# Altium schematic symbol library Altium_Lib.SchLib: 403 symbols (part 1 of 4) (continued)
## CONN_2_POS__0353630260 (continued)
CONN HEADER 2POS 2MM R/A TIN; Manufacturer: Molex, LLC; Contact Length - Post: 0.126" (3.20mm); Shrouding: Shrouded - 4 Wall; Number of Positions Loaded: All; Pitch - Mating: 0.079" (2.00mm); Style: Board to Cable/Wire; Number of Positions: 2; Contact Length - Mating: 0.145" (3.70mm); Material Flammability Rating: UL94 V-0; Contact Shape: Square; Contact Finish - Post: Tin; Contact Material: Brass; Contact Finish Thickness - Mating: 78.7µin (2.00µm); Contact Finish - Mating: Tin; Insulation Height: 0.217" (5.51mm); Contact Type: Male Pin; Manufacturer Part Number: 0353630260; RoHS: RoHS Compliant; Part Status: Active; Row Spacing - Mating: -; Packaging: Bulk; Termination: Solder; Category: Connectors, Interconnects; Mounting Type: Through Hole, Right Angle; Number of Rows: 1; Fastening Type: Locking Ramp; Overall Contact Length: -; Connector Type: Header; Supplier: Digi-Key; Insulation Material: Polyamide (PA), Nylon; Features: -; Insulation Color: Natural; Current Rating: -; Voltage Rating: -; Operating Temperature: -; Mated Stacking Heights: -; Contact Finish Thickness - Post: 78.7µin (2.00µm); Applications: Automotive, General Purpose; Ingress Protection: -; ComponentLink1URL: https://www.molex.com/pdm_docs/sd/353630260_sd.pdf; ComponentLink1Description: https://www.molex.com/pdm_docs/sd/353630260_sd.pdf; Pricing: 1=0.3, 10=0.286, 100=0.2002, 500=0.17158, 1000=0.14298, 5000=0.12255, 10000=0.11438 (USD); Supplier Part Number: WM18931-ND
footprint CONN_2_POS__0353630260
pins: 1 (io), 2 (io)

## CONN_2_POS__0530480210
designator J?, comment 0530480210
CONN HEADER 2POS 1.25MM R/A TIN; Manufacturer: Molex, LLC; Shrouding: Shrouded - 4 Wall; Contact Length - Post: 0.091" (2.30mm); Material Flammability Rating: UL94 V-0; Pitch - Mating: 0.049" (1.25mm); Number of Positions Loaded: All; Number of Positions: 2; Style: Board to Cable/Wire; Contact Material: Phosphor Bronze; Ingress Protection: -; Mated Stacking Heights: -; Fastening Type: Detent Lock; RoHS: RoHS Compliant; Contact Shape: Rectangular; Voltage Rating: -; Connector Type: Header; Contact Finish - Mating: Tin; Packaging: Tray; Contact Type: Male Blade; Insulation Color: Natural; Insulation Height: 0.138" (3.50mm); Mounting Type: Through Hole, Right Angle; Insulation Material: Polyamide (PA), Nylon; Contact Finish - Post: Tin; Contact Length - Mating: -; Overall Contact Length: -; Row Spacing - Mating: -; Features: -; Manufacturer Part Number: 0530480210; Termination: Solder; Current Rating: -; Supplier: Digi-Key; Number of Rows: 1; Contact Finish Thickness - Mating: -; Part Status: Active; Operating Temperature: -; Category: Connectors, Interconnects; Contact Finish Thickness - Post: -; Applications: Automotive, General Purpose, Industrial, Medical; ComponentLink1URL: https://www.molex.com/pdm_docs/sd/530480210_sd.pdf; ComponentLink1Description: https://www.molex.com/pdm_docs/sd/530480210_sd.pdf; Pricing: 1=0.39, 10=0.369, 100=0.258, 500=0.22114, 1000=0.18428, 5000=0.15795, 10000=0.14742 (USD); Supplier Part Number: WM1742-ND
footprint CONN_2_POS__0530480210
pins: 1 (io), 2 (io)

## CONN_2_POS__0532610271
designator J?, comment 0532610271
CONN HEADER 2POS 1.25MM R/A SMD; Manufacturer: Molex, LLC; Style: Board to Cable/Wire; Mated Stacking Heights: 3.4mm; Pitch - Mating: 0.049" (1.25mm); Number of Positions Loaded: All; Shrouding: Shrouded - 4 Wall; Material Flammability Rating: UL94 V-0; Number of Positions: 2; Contact Finish - Mating: Tin; Contact Material: Phosphor Bronze; Operating Temperature: -; Category: Connectors, Interconnects; Overall Contact Length: -; Packaging: Tape & Reel (TR); Supplier: Digi-Key; Voltage Rating: -; Contact Length - Post: -; Contact Finish - Post: Tin; Contact Finish Thickness - Mating: 39µin (1.00µm); Contact Finish Thickness - Post: -; Applications: Automotive, General Purpose, Industrial, Medical; Row Spacing - Mating: -; Connector Type: Header; Current Rating: -; Insulation Color: Natural; Contact Length - Mating: -; Manufacturer Part Number: 0532610271; Insulation Material: Polyamide (PA46), Nylon 4/6; Ingress Protection: -; Features: Solder Retention; Mounting Type: Surface Mount, Right Angle; Contact Type: Male Blade; RoHS: RoHS Compliant; Part Status: Active; Termination: Solder; Contact Shape: Rectangular; Insulation Height: 0.134" (3.40mm); Number of Rows: 1; Fastening Type: Detent Lock; ComponentLink1URL: http://www.molex.com/pdm_docs/sd/532610271_sd.pdf; ComponentLink1Description: http://www.molex.com/pdm_docs/sd/532610271_sd.pdf; Pricing: 1000=0.4672, 2000=0.438, 3000=0.4234, 5000=0.4088, 10000=0.38836, 25000=0.3796 (USD); Supplier Part Number: WM7620TR-ND
footprint CONN_2_POS__0532610271
pins: 1 (io), 2 (io)

## CONN_2_POS__0559350210
designator J?, comment 0559350210
2.0 WTB PLG HSG ASSY RA; Manufacturer: Molex, LLC; Contact Length - Post: 0.126" (3.20mm); Contact Length - Mating: 0.144" (3.66mm); Shrouding: Shrouded - 4 Wall; Style: Board to Cable/Wire; Pitch - Mating: 0.079" (2.00mm); Connector Type: Header; Number of Positions: 2; Number of Positions Loaded: All; Insulation Color: Natural; Material Flammability Rating: -; Ingress Protection: -; Insulation Material: Polybutylene Terephthalate (PBT); Applications: General Purpose, Industrial, Medical; Mated Stacking Heights: -; Features: Board Guide; Contact Finish - Mating: Tin; Operating Temperature: -; Insulation Height: 0.264" (6.70mm); Contact Finish Thickness - Post: -; Overall Contact Length: -; Current Rating: -; Contact Finish Thickness - Mating: -; Contact Material: -; Contact Finish - Post: Tin; Voltage Rating: -; Contact Shape: Square; RoHS: RoHS Compliant; Number of Rows: 1; Mounting Type: Through Hole, Right Angle; Fastening Type: Latch Holder; Termination: Kinked Pin, Solder; Category: Connectors, Interconnects; Row Spacing - Mating: -; Manufacturer Part Number: 0559350210; Part Status: Active; Contact Type: Male Pin; Supplier: Digi-Key; Packaging: Tray; ComponentLink1URL: https://www.molex.com/pdm_docs/sd/559350210_sd.pdf; ComponentLink1Description: https://www.molex.com/pdm_docs/sd/559350210_sd.pdf; Pricing: 1=0.46, 10=0.433, 100=0.3031, 500=0.25978, 1500=0.20534, 6000=0.18555, 10500=0.17318 (USD); Supplier Part Number: WM14662-ND
footprint CONN_2_POS__0559350210
pins: 1 (io), 2 (io)

## CONN_2_POS__0705530001
designator J?, comment 0705530001
CONN HEADER 2POS .100 R/A GOLD; Manufacturer: Molex, LLC; Contact Length - Mating: 0.240" (6.10mm); Number of Positions: 2; Number of Positions Loaded: All; Pitch - Mating: 0.100" (2.54mm); Shrouding: Shrouded - 4 Wall; Category: Connectors, Interconnects; Connector Type: Header; Contact Finish - Mating: Gold; Contact Finish Thickness - Mating: 15µin (0.38µm); Contact Type: Male Pin; Fastening Type: Latch Holder; Features: -; Ingress Protection: -; Insulation Color: Black; Manufacturer Part Number: 0705530001; Mounting Type: Through Hole, Right Angle; Number of Rows: 1; Part Status: Active; Packaging: Tube; RoHS: RoHS Compliant; Row Spacing - Mating: -; Supplier: Digi-Key; Termination: Solder; ComponentLink1URL: http://www.molex.com/pdm_docs/sd/705530001_sd.pdf; ComponentLink1Description: http://www.molex.com/pdm_docs/sd/705530001_sd.pdf; Pricing: 1=0.74, 10=0.651, 50=0.5868, 100=0.5612, 250=0.5102, 500=0.45918, 1000=0.40816, 2500=0.3699, 5000=0.35714 (USD); Supplier Part Number: WM4900-ND
footprint CONN_2_POS__705530001
pins: 1 (io), 2 (io)

## CONN_2_POS__0768250002
designator J?, comment 0768250002
DUAL ROW RA HEADER TIN 2CKT; Manufacturer: Molex, LLC; Number of Positions: 2; Style: Board to Cable/Wire; Row Spacing - Mating: 0.224" (5.70mm); Number of Positions Loaded: All; Contact Length - Post: 0.142" (3.60mm); Shrouding: Shrouded - 4 Wall; Material Flammability Rating: UL94 V-0; Supplier: Digi-Key; Number of Rows: 2; RoHS: RoHS Compliant; Packaging: Tray; Manufacturer Part Number: 0768250002; Part Status: Active; Pitch - Mating: -; Connector Type: Header; Contact Type: Male Pin; Category: Connectors, Interconnects; Mounting Type: Through Hole, Right Angle; Overall Contact Length: -; Insulation Height: 0.572" (14.53mm); Termination: Solder; Contact Finish - Post: Tin; Contact Finish Thickness - Mating: 60.0µin (1.52µm); Contact Length - Mating: -; Fastening Type: Locking Ramp; Contact Finish - Mating: Tin; Contact Shape: Square; Contact Finish Thickness - Post: 60.0µin (1.52µm); Current Rating: -; Applications: Automotive, General Purpose, Industrial, Telecommunications; Voltage Rating: -; Mated Stacking Heights: -; Insulation Color: Black; Ingress Protection: -; Operating Temperature: -; Features: Board Guide, Glow Wire Compliant; Insulation Material: Liquid Crystal Polymer (LCP); Contact Material: Copper; ComponentLink1URL: https://www.molex.com/pdm_docs/sd/768250002_sd.pdf; ComponentLink1Description: https://www.molex.com/pdm_docs/sd/768250002_sd.pdf; Pricing: 1=1.08, 10=0.946, 25=0.89, 50=0.853, 100=0.816, 250=0.7418, 500=0.66762, 1000=0.59344, 2500=0.5378 (USD); Supplier Part Number: WM11969-ND
footprint CONN_2_POS__0768250002
pins: 1 (io), 2 (io)

## CONN_2_POS__B2B-XH-A(LF)(SN)
designator J?, comment B2B-XH-A(LF)(SN)
CONN HEADER XH TOP 2POS 2.5MM; Manufacturer: JST Sales America Inc.; Pitch - Mating: 0.098" (2.50mm); Style: Board to Cable/Wire; Shrouding: Shrouded - 4 Wall; Number of Positions: 2; Number of Positions Loaded: All; Contact Length - Post: 0.134" (3.40mm); Material Flammability Rating: UL94 V-0; Current Rating: 3A; Voltage Rating: 250V; Mated Stacking Heights: 9.8mm; Manufacturer Part Number: B2B-XH-A(LF)(SN); Category: Connectors, Interconnects; Supplier: Digi-Key; RoHS: RoHS Compliant; Packaging: Bulk; Part Status: Active; Connector Type: Header; Contact Type: Male Pin; Number of Rows: 1; Row Spacing - Mating: -; Mounting Type: Through Hole; Termination: Press-Fit, Solder; Fastening Type: Detent Lock; Contact Length - Mating: -; Overall Contact Length: -; Insulation Height: 0.276" (7.00mm); Contact Shape: Square; Contact Finish - Mating: Tin; Contact Finish Thickness - Mating: -; Contact Finish - Post: Tin; Contact Material: Brass; Insulation Material: Polyamide (PA66), Nylon 6/6; Features: -; Operating Temperature: -25°C ~ 85°C; Ingress Protection: -; Insulation Color: Natural; Contact Finish Thickness - Post: -; Applications: -; ComponentLink1URL: http://www.jst-mfg.com/product/pdf/eng/eXH.pdf; ComponentLink1Description: http://www.jst-mfg.com/product/pdf/eng/eXH.pdf; Supplier Part Number: 455-2247-ND
footprint CONN_2_POS__B2B-XH-A(LF)(SN)
pins: 1 (io), 2 (io)

## CONN_2_POS__S2B-XH-A(LF)(SN)
designator J?, comment S2B-XH-A(LF)(SN)
CONN HEADER XH SIDE 2POS 2.5MM; Manufacturer: JST Sales America Inc.; Contact Length - Post: 0.134" (3.40mm); Pitch - Mating: 0.098" (2.50mm); Shrouding: Shrouded - 4 Wall; Number of Positions Loaded: All; Style: Board to Cable/Wire; Number of Positions: 2; Mated Stacking Heights: 6.1mm; Material Flammability Rating: UL94 V-0; Current Rating: 3A; Voltage Rating: 250V; Overall Contact Length: -; Packaging: Bulk; Number of Rows: 1; Contact Length - Mating: -; Contact Shape: Square; Supplier: Digi-Key; Contact Type: Male Pin; Connector Type: Header; Manufacturer Part Number: S2B-XH-A(LF)(SN); Insulation Height: 0.240" (6.10mm); RoHS: RoHS Compliant; Mounting Type: Through Hole, Right Angle; Fastening Type: Detent Lock; Contact Finish - Post: Tin; Category: Connectors, Interconnects; Part Status: Active; Termination: Press-Fit, Solder; Contact Finish Thickness - Mating: -; Contact Finish - Mating: Tin; Row Spacing - Mating: -; Ingress Protection: -; Contact Finish Thickness - Post: -; Applications: -; Insulation Color: Natural; Insulation Material: Polyamide (PA66), Nylon 6/6; Operating Temperature: -25°C ~ 85°C; Contact Material: Brass; Features: -; ComponentLink1URL: http://www.jst-mfg.com/product/pdf/eng/eXH.pdf; ComponentLink1Description: http://www.jst-mfg.com/product/pdf/eng/eXH.pdf; Pricing: 1=0.17, 10=0.162, 100=0.1126, 500=0.09524, 1000=0.07792, 5000=0.06927, 10000=0.06277 (USD); Supplier Part Number: 455-2257-ND
footprint CONN_2_POS__S2B-XH-A(LF)(SN)
pins: 1 (io), 2 (io)

## CONN_3_POS__0022057035
designator J?, comment 0022057035
CONN HEADER 3POS 2.5MM R/A TIN; Manufacturer: Molex, LLC; Shrouding: Shrouded - 4 Wall; Style: Board to Cable/Wire; Number of Positions Loaded: All; Number of Positions: 3; Contact Length - Post: 0.138" (3.50mm); Pitch - Mating: 0.098" (2.50mm); Material Flammability Rating: UL94 V-0; Manufacturer Part Number: 0022057035; Supplier: Digi-Key; Category: Connectors, Interconnects; Mounting Type: Through Hole, Right Angle; Row Spacing - Mating: -; Number of Rows: 1; Contact Finish - Mating: Tin; Contact Shape: Circular; Insulation Height: 0.193" (4.90mm); Voltage Rating: -; Current Rating: -; Insulation Color: Natural; Termination: Solder; RoHS: RoHS Compliant; Connector Type: Header; Part Status: Active; Packaging: Bulk; Contact Finish - Post: Tin; Contact Finish Thickness - Mating: 160µin (4.06µm); Insulation Material: Polyamide (PA66), Nylon 6/6, Glass Filled; Contact Material: Brass; Overall Contact Length: -; Operating Temperature: -; Features: -; Contact Finish Thickness - Post: 160µin (4.06µm); Applications: Automotive, General Purpose, Industrial, Medical, Telecommunications; Mated Stacking Heights: -; Contact Type: Male Pin; Ingress Protection: -; Contact Length - Mating: 0.138" (3.50mm); Fastening Type: Detent Lock; ComponentLink1URL: http://www.molex.com/pdm_docs/sd/022057035_sd.pdf; ComponentLink1Description: http://www.molex.com/pdm_docs/sd/022057035_sd.pdf; Pricing: 1=0.54, 10=0.502, 100=0.3846, 500=0.3344, 1000=0.27588, 5000=0.24244, 10000=0.22572 (USD); Supplier Part Number: WM18901-ND
footprint CONN_3_POS__0022057035
pins: 1 (io), 2 (io), 3 (io)

## CONN_3_POS__0532610371
designator J?, comment 53261-0371
CONN HEADER SMD R/A 3POS 1.25MM; Manufacturer: Molex; Current Rating: 1 A; Mounting Angle: Right Angle; Number of Positions: 3 Position; Voltage Rating: 125 V; Supplier 1: Mouser; Manufacturer Part Number: 53261-0371; RoHS: RoHS Compliant; Category: Headers & Wire Housings; Stock 1: 19235; Pricing 1: 1=1.13, 10=0.987, 100=0.845, 500=0.659, 1000=0.292, 2000=0.257 (USD); Accessory Type: -; Contact Plating: Tin; Contact Type: -; Housing Material: Thermoplastic; Number of Rows: 1 Row; Packaging: Cut Tape; Product: Headers; Series: 53261; Termination Style: SMD/SMT; Type: Shrouded; Brand: Molex; Contact Material: Tin; Flammability Rating: UL 94 V-0; Mounting Style: SMD/SMT; Pitch: 1.25 mm; Row Spacing: -; Contact Gender: Pin (Male); Housing Color: Natural; Maximum Operating Temperature: + 105 C; Minimum Operating Temperature: - 40 C; Product Type: Headers & Wire Housings; Standard Pack Qty: 1000; Subcategory: Headers & Wire Housings; Tradename: PicoBlade; RoHS - Mouser: Y; Minimum Order Quantity: 1; Reeling: True; ComponentLink1URL: https://www.mouser.com/datasheet/2/276/0532610371_PCB_HEADERS-146538.pdf; ComponentLink1Description: https://www.mouser.com/datasheet/2/276/0532610371_PCB_HEADERS-146538.pdf; Supplier Part Number 1: 538-53261-0371
footprint CONN_3_POS__0532610371
pins: 1 (io), 2 (io), 3 (io)

## CONN_3_POS__0705530002
designator J?, comment 70553-0002
MOLEX - 70553-0002 - WIRE-BOARD CONNECTOR, HEADER, 3 POSITION, 2.54MM; Manufacturer: MOLEX; RoHS: YES; Manufacturer Part Number: 70553-0002; Supplier: Newark; ComponentLink1URL: http://www.farnell.com/datasheets/2209020.pdf; ComponentLink1Description: http://www.farnell.com/datasheets/2209020.pdf; ComponentLink2URL: http://www.farnell.com/cad/2023942.pdf; ComponentLink2Description: http://www.farnell.com/cad/2023942.pdf; ComponentLink3URL: http://www.farnell.com/cad/1990527.zip; ComponentLink3Description: http://www.farnell.com/cad/1990527.zip; ComponentLink4URL: http://www.farnell.com/datasheets/1024957.pdf; ComponentLink4Description: http://www.farnell.com/datasheets/1024957.pdf; Stock: 687; Supplier Part Number: 59H2871
footprint CONN_3_POS__705530002
pins: 1 (io), 2 (io), 3 (io)

## CONN_3_POS__B3B-XH-A(LF)(SN)
designator J?, comment B3B-XH-A(LF)(SN)
CONN HEADER XH TOP 3POS 2.5MM; Manufacturer: JST Sales America Inc.; Shrouding: Shrouded - 4 Wall; Style: Board to Cable/Wire; Pitch - Mating: 0.098" (2.50mm); Number of Positions Loaded: All; Number of Positions: 3; Contact Length - Post: 0.134" (3.40mm); Material Flammability Rating: UL94 V-0; Current Rating: 3A; Voltage Rating: 250V; Mated Stacking Heights: 9.8mm; Contact Finish - Post: Tin; Contact Finish Thickness - Mating: -; Contact Shape: Square; Contact Finish - Mating: Tin; Insulation Height: 0.276" (7.00mm); Mounting Type: Through Hole; Number of Rows: 1; Part Status: Active; Supplier: Digi-Key; Fastening Type: Detent Lock; Contact Length - Mating: -; Row Spacing - Mating: -; Connector Type: Header; Packaging: Bulk; Contact Type: Male Pin; Category: Connectors, Interconnects; RoHS: RoHS Compliant; Termination: Press-Fit, Solder; Manufacturer Part Number: B3B-XH-A(LF)(SN); Overall Contact Length: -; Insulation Material: Polyamide (PA66), Nylon 6/6; Features: -; Insulation Color: Natural; Operating Temperature: -25°C ~ 85°C; Ingress Protection: -; Contact Finish Thickness - Post: -; Applications: -; Contact Material: Brass; ComponentLink1URL: http://www.jst-mfg.com/product/pdf/eng/eXH.pdf; ComponentLink1Description: http://www.jst-mfg.com/product/pdf/eng/eXH.pdf; Pricing: 1=0.19, 10=0.181, 100=0.1115, 500=0.09228, 1000=0.08075, 5000=0.06921, 10000=0.06729 (USD); Supplier Part Number: 455-2248-ND
footprint CONN_3_POS__B3B-XH-A(LF)(SN)
pins: 1 (io), 2 (io), 3 (io)

## CONN_3_POS__S3B-XH-A(LF)(SN)
designator J?, comment S3B-XH-SM4-TB(LF)(SN)
CONN HEADER R/A 3POS 2.5MM; Manufacturer: JST; TotalNumberofContacts: 3; StyleConnectorsPCB: StraightHeaderPlug; TerminationConnectorsPCB: Crimp; WorkingVoltage: 250; ContactMaterialRelay: Copper Alloy; ContactPlating: Tin; MaterialConnectorsRectangularPlasticIndustrial: Polyamide; NumberofRows: 1; Gender: Male; TypeConnectorsPCB: WiretoBoard; MatingTypeConnectorsRectangularPlasticIndustrial: DetentLock; InsulationResistance: 1000000000; Supplier 1: Future Electronics; Manufacturer Part Number: S3B-XH-SM4-TB(LF)(SN); RoHS: Y; Category: Header (Plug) - Board Mount; Stock 1: 3000; Pricing 1: 500=0,4200, 1000=0,3400, 2000=0,3300, 7500=0,3150 (USD); OperatingTempRange: -25|85; CurrentRating: 3; Color: Natural; CenterLine/ContactSpacing: 2.5 mm; ComponentLink1URL: http://www.jst-mfg.com/product/pdf/eng/eXH.pdf; ComponentLink1Description: http://www.jst-mfg.com/product/pdf/eng/eXH.pdf; Supplier Part Number 1: 4056388
footprint CONN_3_POS__S3B-XH-A(LF)(SN)
pins: 1 (io), 2 (io), 3 (io)

## CONN_4_POS__22-05-7045
designator J?, comment 22-05-7045
CONN HEADER 4POS 2.5MM R/A TIN; Manufacturer: Molex Connector Corporation; Material Flammability Rating: UL94 V-0; Contact Length - Mating: 0.138" (3.50mm); Number of Positions: 4; Pitch - Mating: 0.098" (2.50mm); Style: Board to Cable/Wire; Shrouding: Shrouded - 4 Wall; Number of Positions Loaded: All; Applications: Automotive, General Purpose, Industrial, Medical, Telecommunications; Contact Finish Thickness - Post: 160µin (4.06µm); Mated Stacking Heights: -; Contact Material: Brass; Insulation Height: 0.193" (4.90mm); Overall Contact Length: -; Insulation Color: Natural; Ingress Protection: -; RoHS: RoHS Compliant; Packaging: Bulk; Contact Type: Male Pin; Termination: Solder; Contact Shape: Circular; Row Spacing - Mating: -; Insulation Material: Polyamide (PA66), Nylon 6/6, Glass Filled; Features: -; Operating Temperature: -; Category: Connectors, Interconnects; Part Status: Active; Connector Type: Header; Supplier: Digi-Key; Manufacturer Part Number: 22-05-7045; Fastening Type: Detent Lock; Contact Length - Post: 0.138" (3.50mm); Mounting Type: Through Hole, Right Angle; Contact Finish - Mating: Tin; Contact Finish Thickness - Mating: 160µin (4.06µm); Contact Finish - Post: Tin; Number of Rows: 1; Current Rating: -; Voltage Rating: -; ComponentLink1URL: http://www.molex.com/pdm_docs/sd/022057045_sd.pdf; ComponentLink1Description: http://www.molex.com/pdm_docs/sd/022057045_sd.pdf; Pricing: 1=0.79, 10=0.738, 100=0.5658, 500=0.492, 1000=0.4059, 5000=0.3567, 10000=0.3321 (USD); Supplier Part Number: WM18902-ND
footprint CONN_4_POS__22-05-7045 (2.50mm Wafer connector (molex))
pins: 1 (io), 2 (io), 3 (io), 4 (io)

## CONN_4_POS__43045-0400
designator J?, comment 0430450400
CONN HEADER 4POS 3MM RT ANG TIN; Manufacturer: Molex, LLC; Pitch - Mating: 0.118" (3.00mm); Contact Length - Post: 0.125" (3.18mm); Material Flammability Rating: UL94 V-0; Style: Board to Cable/Wire; Shrouding: Shrouded - 4 Wall; Number of Positions: 4; Number of Positions Loaded: All; Manufacturer Part Number: 0430450400; Contact Finish Thickness - Mating: 100µin (2.54µm); Supplier: Digi-Key; Packaging: Tray; RoHS: RoHS Compliant; Contact Type: Male Pin; Part Status: Active; Connector Type: Header; Contact Length - Mating: -; Mounting Type: Through Hole, Right Angle; Overall Contact Length: -; Insulation Height: 0.290" (7.37mm); Contact Shape: Square; Insulation Color: Black; Ingress Protection: -; Contact Material: Brass; Operating Temperature: -; Insulation Material: Liquid Crystal Polymer (LCP), Glass Filled; Voltage Rating: -; Current Rating: -; Mated Stacking Heights: -; Contact Finish Thickness - Post: -; Applications: General Purpose, Medical, Military, Telecommunications; Contact Finish - Mating: Tin; Termination: Solder; Fastening Type: Locking Ramp; Features: Board Lock; Contact Finish - Post: Tin; Category: Connectors, Interconnects; Number of Rows: 2; Row Spacing - Mating: 0.118" (3.00mm); ComponentLink1URL: http://www.molex.com/pdm_docs/sd/430450400_sd.pdf; ComponentLink1Description: http://www.molex.com/pdm_docs/sd/430450400_sd.pdf; Pricing: 1=1.35, 10=1.228, 50=1.1026, 100=1.0525, 250=0.95228, 500=0.8771, 1000=0.7518, 2500=0.70168, 5000=0.6666 (USD); Supplier Part Number: WM1814-ND
footprint CONN_4_POS__43045-0400
pins: 1 (io), 2 (io), 3 (io), 4 (io)

## CONN_4_POS__53047-0410
designator J?, comment 0530470410
1.25mm (.049") Pitch PicoBlade Wire-to-Board Header, Vertical, with Friction Lock, 4 Circuits; Manufacturer: Molex; Number of Contacts: 4; Contact Resistance: 20mR; Max Voltage Rating (AC): 125V; Connector Type: Blade Pin; Pitch: 0.049inch; Supplier 1: Avnet; Manufacturer Part Number: 0530470410; Stock 1: 65946; Pricing 1: 1=0.1162, 10=0.1145, 30=0.1129, 50=0.1112, 100=0.1088, 250=0.1063, 500=0.1038 (USD); Mount: Through Hole; Contact Plating: Tin; Contact Material: Bronze; Color: Natural; Housing Color: White; Housing Material: Nylon; Min Operating Temperature: -40°C; Max Operating Temperature: 85°C; Termination: Solder; Number of Rows: 1; Packaging: Tray; Number of Positions: 4; Orientation: Straight; Series: PicoBlade™ 53047; Contact Type: Blade Pin; Length: 6.75mm; Depth: 3.2mm; Contact Mating Length: 0.089inch; RoHS Compliant: Yes; ComponentLink1URL: http://components.arrow.com/part/dataview/2938462S4237926N3303?src-supplier=Arrow+Electronics; ComponentLink1Description: http://components.arrow.com/part/dataview/2938462S4237926N3303?src-supplier=Arrow+Electronics; Supplier Part Number 1: 0530470410
footprint CONN_4_POS__053047-0410
pins: 1 (io), 2 (io), 3 (io), 4 (io)

## CONN_4_POS__292206-4
designator J?, comment 292206-4
CONN HEADER 4POS R/A 1.5MM TIN; Manufacturer: TE Connectivity AMP Connectors; Current Rating: Varies by Wire Gauge; Material Flammability Rating: UL94 V-0; Voltage Rating: 50VAC; Contact Length - Mating: 0.094" (2.40mm); Contact Length - Post: 0.118" (3.00mm); Shrouding: Shrouded - 4 Wall; Style: Board to Cable/Wire; Pitch - Mating: 0.059" (1.50mm); Number of Positions: 4; Number of Positions Loaded: All; Insulation Material: Polyamide (PA), Nylon, Glass Filled; Features: -; Contact Finish Thickness - Mating: -; Ingress Protection: -; Operating Temperature: -30°C ~ 105°C; Contact Finish - Post: Tin; Contact Shape: Square; Contact Material: Brass; Insulation Height: 0.193" (4.90mm); Contact Finish Thickness - Post: -; Applications: General Purpose; Contact Finish - Mating: Tin; Insulation Color: Gray; Termination: Kinked Pin, Solder; Fastening Type: Detent Lock; Overall Contact Length: -; Mated Stacking Heights: -; Mounting Type: Through Hole, Right Angle; Manufacturer Part Number: 292206-4; Number of Rows: 1; Row Spacing - Mating: -; Category: Connectors, Interconnects; Supplier: Digi-Key; Part Status: Active; Contact Type: Male Pin; Packaging: Bulk; Connector Type: Header; RoHS: RoHS Compliant; ComponentLink1URL: https://www.te.com/commerce/DocumentDelivery/DDEController?Action=srchrtrv&DocNm=292206&DocType=Customer+Drawing&DocLang=English; ComponentLink1Description: https://www.te.com/commerce/DocumentDelivery/DDEController?Action=srchrtrv&DocNm=292206&DocType=Customer+Drawing&DocLang=English; Supplier Part Number: A98669-ND
footprint CONN_4_POS__292206-4
pins: 1 (io), 2 (io), 3 (io), 4 (io)

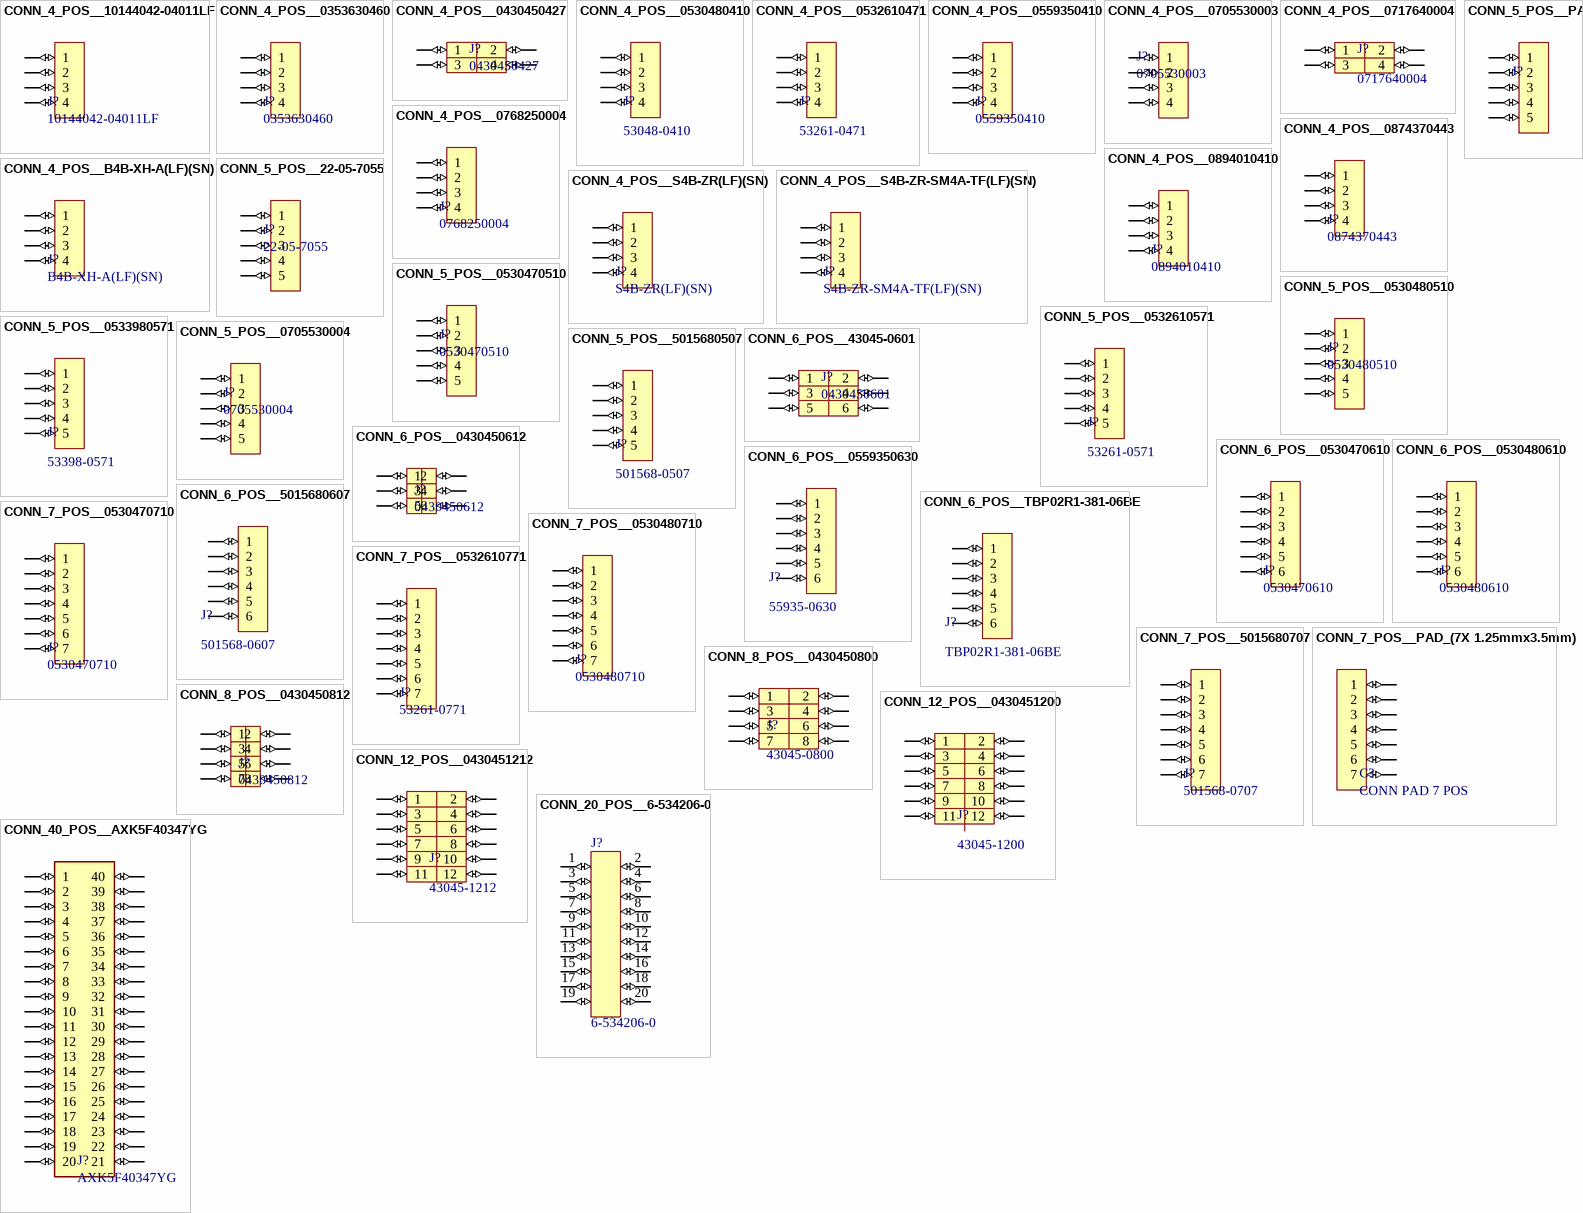
[diagram p2: symbols CONN_4_POS__10144042-04011LF to CONN_40_POS__AXK5F40347YG]

## CONN_4_POS__10144042-04011LF
designator J?, comment 10144042-04011LF
CONN HEADER SMD 4POS 0.8MM; Manufacturer: Amphenol ICC (FCI); Detailed Description: Connector Header Surface Mount 4 position 0.031" (0.80mm); Pitch - Mating: 0.031" (0.80mm); Number of Positions: 4; Style: Board to Cable/Wire; Shrouding: Shrouded - 4 Wall; Manufacturer Part Number: 10144042-04011LF; Connector Type: Header; Contact Type: Male Pin; Number of Rows: 1; Mounting Type: Surface Mount; Termination: Solder; Fastening Type: Push-Pull; Insulation Height: 0.106" (2.70mm); Contact Shape: Rectangular
footprint CONN_4_POS__10144042-04011LF
pins: 1 (io), 2 (io), 3 (io), 4 (io)

## CONN_4_POS__0353630460
designator J?, comment 0353630460
CONN HEADER 4POS 2MM R/A TIN; Manufacturer: Molex Connector Corporation; Shrouding: Shrouded - 4 Wall; Style: Board to Cable/Wire; Pitch - Mating: 0.079" (2.00mm); Material Flammability Rating: UL94 V-0; Contact Length - Mating: 0.145" (3.70mm); Contact Length - Post: 0.126" (3.20mm); Number of Positions Loaded: All; Number of Positions: 4; Insulation Color: Natural; Insulation Material: Polyamide (PA), Nylon; Contact Finish Thickness - Mating: 78.7µin (2.00µm); Insulation Height: 0.217" (5.51mm); Overall Contact Length: -; Part Status: Active; Current Rating: -; RoHS: RoHS Compliant; Ingress Protection: -; Contact Material: Brass; Contact Finish - Post: Tin; Termination: Kinked Pin, Solder; Mounting Type: Through Hole, Right Angle; Fastening Type: Locking Ramp; Row Spacing - Mating: -; Mated Stacking Heights: -; Features: -; Contact Shape: Square; Contact Type: Male Pin; Packaging: Bulk; Supplier: Digi-Key; Manufacturer Part Number: 0353630460; Category: Connectors, Interconnects; Contact Finish Thickness - Post: 78.7µin (2.00µm); Voltage Rating: -; Operating Temperature: -; Contact Finish - Mating: Tin; Number of Rows: 1; Connector Type: Header; Applications: Automotive, General Purpose; ComponentLink1URL: http://www.molex.com/pdm_docs/sd/353630460_sd.pdf; ComponentLink1Description: http://www.molex.com/pdm_docs/sd/353630460_sd.pdf; Pricing: 1=0.48, 10=0.455, 100=0.3184, 500=0.27294, 1000=0.22745, 5000=0.19496, 10000=0.18196 (USD); Supplier Part Number: WM18933-ND
footprint CONN_4_POS__0353630460
pins: 1 (io), 2 (io), 3 (io), 4 (io)

## CONN_4_POS__0430450427
designator J?, comment 0430450427
MICROFIT 3.0 VERT TH HDR DR TIN; Manufacturer: Molex, LLC; Material Flammability Rating: UL94 V-0; Style: Board to Cable/Wire; Contact Length - Post: 0.125" (3.18mm); Number of Positions: 4; Shrouding: Shrouded - 4 Wall; Number of Positions Loaded: All; Row Spacing - Mating: 0.118" (3.00mm); Connector Type: Header; Ingress Protection: -; Insulation Color: Black; Current Rating: -; Voltage Rating: -; Mated Stacking Heights: -; Contact Finish Thickness - Post: -; Applications: General Purpose, Medical, Military, Telecommunications; Contact Material: Brass; Contact Finish - Mating: Tin; Contact Finish - Post: Tin; Contact Shape: Square; Insulation Height: 0.390" (9.91mm); Part Status: Active; Contact Type: Male Pin; Manufacturer Part Number: 0430450427; Number of Rows: 2; Termination: Solder; Mounting Type: Through Hole; RoHS: RoHS Compliant; Overall Contact Length: -; Packaging: Tray; Contact Length - Mating: -; Pitch - Mating: 0.118" (3.00mm); Fastening Type: Locking Ramp; Supplier: Digi-Key; Category: Connectors, Interconnects; Contact Finish Thickness - Mating: 60µin (1.52µm); Insulation Material: Liquid Crystal Polymer (LCP), Glass Filled; Features: Board Guide; Operating Temperature: -; ComponentLink1URL: http://www.molex.com/pdm_docs/sd/430450427_sd.pdf; ComponentLink1Description: http://www.molex.com/pdm_docs/sd/430450427_sd.pdf; Supplier Part Number: WM10667-ND
footprint CONN_4_POS__0430450427
pins: 1 (io), 2 (io), 3 (io), 4 (io)

## CONN_4_POS__0530480410
designator J?, comment 53048-0410
CONN HEADER R/A 4POS 1.25MM; Manufacturer: Molex; Contact Resistance: 20mR; Current Rating: 1A; Voltage Rating: 125V; Number of Positions: 4; Insulation Resistance: 100MR; Gender: Male; Connector Type: Blade Pin; Glow Wire Compliant: Non-compliant; Supplier 1: Avnet; Manufacturer Part Number: 53048-0410; Stock 1: 44; Pricing 1: 1=0.1232 (USD); Mount: Through Hole; Case/Package: 0410; Contact Material: Bronze,Tin; Contact Plating: Tin; Color: Natural; Housing Color: Natural; Housing Material: Nylon; Min Operating Temperature: -40°C; Max Operating Temperature: 85°C; Package Quantity: 5000; Number of Rows: 1; Packaging: Tray; Contact Gender: Male; Termination: Solder; Number of Contacts: 4; Orientation: Right Angle; Number of Circuits: 4; Voltage Rating (DC): 125V; Series: PicoBlade; Contact Type: Blade Pin; Pitch: 1.25mm; Depth: 5.5mm; Radiation Hardening: No; REACH SVHC: Unknown; Lead Free: Lead Free; Flammability Rating: UL94 V-0; RoHS Compliant: Yes; ComponentLink1URL: https://www.distrelec.biz/Web/Downloads/60/_e/gg116847-116860_e.pdf?mime=application%2Fpdf&src-supplier=Distrelec; ComponentLink1Description: https://www.distrelec.biz/Web/Downloads/60/_e/gg116847-116860_e.pdf?mime=application%2Fpdf&src-supplier=Distrelec; ComponentLink2URL: http://uk.rs-online.com/webdocs/1362/0900766b81362ba7.pdf?src-supplier=RSComponents; ComponentLink2Description: http://uk.rs-online.com/webdocs/1362/0900766b81362ba7.pdf?src-supplier=RSComponents; ComponentLink3URL: http://www.molex.com/webdocs/datasheets/pdf/en-us/0530480410_PCB_HEADERS.pdf?src-supplier=Avnet; ComponentLink3Description: http://www.molex.com/webdocs/datasheets/pdf/en-us/0530480410_PCB_HEADERS.pdf?src-supplier=Avnet; ComponentLink4URL: http://www.mouser.com/ds/2/276/0530480410_PCB_HEADERS-170930.pdf?src-supplier=Mouser; ComponentLink4Description: http://www.mouser.com/ds/2/276/0530480410_PCB_HEADERS-170930.pdf?src-supplier=Mouser; Supplier Part Number 1: 53048-0410
footprint CONN_4_POS__0530480410
pins: 1 (io), 2 (io), 3 (io), 4 (io)

## CONN_4_POS__0532610471
designator J?, comment 53261-0471
CONN HEADER SMD R/A 4POS 1.25MM; Manufacturer: Molex; Current Rating: 1 A; Mounting Angle: Right Angle; Number of Positions: 4 Position; Voltage Rating: 125 V; Supplier 1: Mouser; Manufacturer Part Number: 53261-0471; RoHS: RoHS Compliant; Category: Headers & Wire Housings; Stock 1: 0; Pricing 1: 1=1.24, 10=1.08, 100=0.939, 500=0.768, 1000=0.308 (USD); Accessory Type: -; Contact Plating: Tin; Contact Type: -; Housing Material: Thermoplastic; Number of Rows: 1 Row; Packaging: Cut Tape; Product: Headers; Series: 53261; Termination Style: SMD/SMT; Type: Shrouded; Brand: Molex; Contact Material: Tin; Flammability Rating: UL 94 V-0; Mounting Style: SMD/SMT; Pitch: 1.25 mm; Row Spacing: -; Contact Gender: Pin (Male); Housing Color: Natural; Maximum Operating Temperature: + 105 C; Minimum Operating Temperature: - 40 C; Product Type: Headers & Wire Housings; Standard Pack Qty: 1000; Subcategory: Headers & Wire Housings; Tradename: PicoBlade; RoHS - Mouser: Y; Minimum Order Quantity: 1; Reeling: True; ComponentLink1URL: https://www.mouser.com/datasheet/2/276/0532610471_PCB_HEADERS-170942.pdf; ComponentLink1Description: https://www.mouser.com/datasheet/2/276/0532610471_PCB_HEADERS-170942.pdf; Supplier Part Number 1: 538-53261-0471
footprint CONN_4_POS__0532610471
pins: 1 (io), 2 (io), 3 (io), 4 (io)

## CONN_4_POS__0559350410
designator J?, comment 0559350410
2.0 WTB PLG HSG ASSY RA; Manufacturer: Molex, LLC; Connector Type: Header; Pitch - Mating: 0.079" (2.00mm); Number of Positions: 4; Shrouding: Shrouded - 4 Wall; Contact Length - Post: 0.126" (3.20mm); Contact Length - Mating: 0.144" (3.66mm); Style: Board to Cable/Wire; Number of Positions Loaded: All; Mated Stacking Heights: 7.15mm; Fastening Type: Latch Holder; Termination: Kinked Pin, Solder; Contact Shape: Square; Insulation Height: 0.264" (6.70mm); Row Spacing - Mating: -; Contact Type: Male Pin; Part Status: Active; Number of Rows: 1; Packaging: Tray; RoHS: RoHS Compliant; Mounting Type: Through Hole, Right Angle; Overall Contact Length: -; Category: Connectors, Interconnects; Supplier: Digi-Key; Manufacturer Part Number: 0559350410; Contact Finish - Post: Tin; Contact Finish Thickness - Mating: -; Contact Finish - Mating: Tin; Contact Material: -; Insulation Material: Polybutylene Terephthalate (PBT); Features: Board Guide; Operating Temperature: -; Ingress Protection: -; Material Flammability Rating: -; Insulation Color: Natural; Current Rating: -; Voltage Rating: -; Contact Finish Thickness - Post: -; Applications: General Purpose, Industrial, Medical; Supplier Part Number: WM12299-ND; ComponentLink1URL: http://www.molex.com/pdm_docs/sd/559350410_sd.pdf; ComponentLink1Description: http://www.molex.com/pdm_docs/sd/559350410_sd.pdf; Pricing: 1=0.42, 10=0.397, 100=0.2776, 500=0.23794, 1000=0.19828, 5000=0.16995, 10000=0.15862 (USD)
footprint CONN_4_POS__0559350410
pins: 1 (io), 2 (io), 3 (io), 4 (io)

## CONN_4_POS__0705530003
designator J?, comment 0705530003
CONN HEADER 4POS .100 R/A GOLD; Manufacturer: Molex, LLC; Contact Length - Mating: 0.240" (6.10mm); Number of Positions: 4; Number of Positions Loaded: All; Pitch - Mating: 0.100" (2.54mm); Shrouding: Shrouded - 4 Wall; Category: Connectors, Interconnects; Connector Type: Header; Contact Finish - Mating: Gold; Contact Finish Thickness - Mating: 15µin (0.38µm); Contact Type: Male Pin; Fastening Type: Latch Holder; Features: -; Ingress Protection: -; Insulation Color: Black; Manufacturer Part Number: 0705530003; Mounting Type: Through Hole, Right Angle; Number of Rows: 1; Packaging: Tube; Part Status: Active; RoHS: RoHS Compliant; Row Spacing - Mating: -; Supplier: Digi-Key; Termination: Solder; ComponentLink1URL: http://www.molex.com/pdm_docs/sd/705530002_sd.pdf; ComponentLink1Description: http://www.molex.com/pdm_docs/sd/705530002_sd.pdf; Pricing: 1=1.1, 10=0.971, 50=0.8758, 100=0.8378, 250=0.7616, 500=0.68544, 1000=0.60928, 2500=0.55216, 5000=0.53312 (USD); Supplier Part Number: WM4902-ND
footprint CONN_4_POS__705530003
pins: 1 (io), 2 (io), 3 (io), 4 (io)

## CONN_4_POS__0717640004
designator J?, comment 0717640004
Headers & Wire Housings HDR RA 2X02P .1" 240/110 SN; Brand: Molex; Minimum Order Quantity: 1; RoHS: RoHS Compliant; Reeling: False; Product Type: Headers & Wire Housings; Category: Headers & Wire Housings; Manufacturer: Molex; Tradename: C-Grid; Subcategory: Headers & Wire Housings; Series: 71764; Manufacturer Part Number: 0717640004; Supplier: Mouser; ComponentLink1URL: https://www.mouser.com/datasheet/2/276/0717640004_PCB_HEADERS-172989.pdf; ComponentLink1Description: https://www.mouser.com/datasheet/2/276/0717640004_PCB_HEADERS-172989.pdf; Stock: 0; Supplier Part Number: N/A
footprint CONN_4_POS__0717640004
pins: 1 (io), 2 (io), 3 (io), 4 (io)

## CONN_4_POS__0768250004
designator J?, comment 0768250004
DUAL ROW RA HEADER TIN 4CKT; Manufacturer: Molex, LLC; Number of Positions: 4; Row Spacing - Mating: 0.224" (5.70mm); Number of Positions Loaded: All; Material Flammability Rating: UL94 V-0; Style: Board to Cable/Wire; Contact Length - Post: 0.142" (3.60mm); Shrouding: Shrouded - 4 Wall; Number of Rows: 2; Connector Type: Header; Manufacturer Part Number: 0768250004; Supplier: Digi-Key; Category: Connectors, Interconnects; Contact Type: Male Pin; Pitch - Mating: 0.224" (5.70mm); Packaging: Tray; RoHS: RoHS Compliant; Part Status: Active; Voltage Rating: -; Contact Finish Thickness - Mating: 60.0µin (1.52µm); Features: Board Guide, Glow Wire Compliant; Contact Finish - Mating: Tin; Applications: Automotive, General Purpose, Industrial, Telecommunications; Contact Finish Thickness - Post: 60.0µin (1.52µm); Mated Stacking Heights: -; Insulation Color: Black; Termination: Solder; Contact Length - Mating: -; Overall Contact Length: -; Mounting Type: Through Hole, Right Angle; Fastening Type: Locking Ramp; Insulation Height: 0.572" (14.53mm); Contact Shape: Square; Operating Temperature: -; Contact Material: Copper; Contact Finish - Post: Tin; Ingress Protection: -; Insulation Material: Liquid Crystal Polymer (LCP); Current Rating: -; ComponentLink1URL: https://www.molex.com/pdm_docs/sd/768250004_sd.pdf; ComponentLink1Description: https://www.molex.com/pdm_docs/sd/768250004_sd.pdf; Pricing: 1=1.73, 10=1.572, 25=1.476, 50=1.4118, 100=1.3476, 250=1.21924, 500=1.12298, 1000=0.96255, 2500=0.89838 (USD); Supplier Part Number: WM11970-ND
footprint CONN_4_POS__0768250004
pins: 1 (io), 2 (io), 3 (io), 4 (io)

## CONN_4_POS__0874370443
designator J?, comment 0874370443
CONN HEADER 4POS 1.5MM VERT SMD; Manufacturer: Molex, LLC; Shrouding: Shrouded - 4 Wall; Number of Positions Loaded: All; Pitch - Mating: 0.059" (1.50mm); Number of Positions: 4; Style: Board to Cable/Wire; Contact Length - Mating: 0.106" (2.70mm); Mated Stacking Heights: 7.4mm; Material Flammability Rating: UL94 V-0; Packaging: Tape & Reel (TR); Number of Rows: 1; Termination: Solder; Mounting Type: Surface Mount; Row Spacing - Mating: -; RoHS: RoHS Compliant; Manufacturer Part Number: 0874370443; Supplier: Digi-Key; Contact Type: Male Pin; Connector Type: Header; Part Status: Active; Category: Connectors, Interconnects; Fastening Type: Push-Pull; Voltage Rating: -; Overall Contact Length: -; Insulation Color: Beige; Contact Finish - Post: Tin; Insulation Material: Polyamide (PA), Nylon; Contact Material: Brass Alloy; Applications: General Purpose, Medical; Ingress Protection: -; Features: -; Contact Finish Thickness - Mating: 100.0µin (2.54µm); Operating Temperature: -; Contact Shape: Square; Insulation Height: 0.199" (5.05mm); Contact Finish - Mating: Tin; Contact Length - Post: -; Current Rating: -; Contact Finish Thickness - Post: -; ComponentLink1URL: https://www.molex.com/pdm_docs/sd/874370443_sd.pdf; ComponentLink1Description: https://www.molex.com/pdm_docs/sd/874370443_sd.pdf; Pricing: 1000=0.41984, 2000=0.3936, 3000=0.38048, 5000=0.36736, 10000=0.34899, 25000=0.34112 (USD); Supplier Part Number: WM7664TR-ND
pins: 1 (io), 2 (io), 3 (io), 4 (io)

## CONN_4_POS__0894010410
designator J?, comment 0894010410
2.0MM WTB R/A HEADER 894010410; Manufacturer: Molex, LLC; Material Flammability Rating: UL94 V-0; Pitch - Mating: 0.079" (2.00mm); Number of Positions: 4; Number of Positions Loaded: All; Style: Board to Cable/Wire; Shrouding: Shrouded - 4 Wall; Contact Length - Post: 0.118" (3.00mm); Overall Contact Length: -; Insulation Height: 0.199" (5.05mm); Contact Shape: Square; Contact Finish - Mating: Tin; Contact Finish Thickness - Mating: 50.0µin (1.27µm); Contact Finish - Post: Tin; Contact Material: Brass; Insulation Material: Polyamide (PA66), Nylon 6/6; Features: -; Operating Temperature: -; Ingress Protection: -; Insulation Color: Natural; Current Rating: -; Voltage Rating: -; Mated Stacking Heights: -; Contact Finish Thickness - Post: 50.0µin (1.27µm); Applications: -; Manufacturer Part Number: 0894010410; Category: Connectors, Interconnects; Supplier: Digi-Key; RoHS: RoHS Compliant; Packaging: Bulk; Part Status: Active; Connector Type: Header; Contact Type: Male Pin; Number of Rows: 1; Row Spacing - Mating: -; Mounting Type: Through Hole, Right Angle; Termination: Kinked Pin, Solder; Fastening Type: Detent Lock; Contact Length - Mating: -; ComponentLink1URL: https://www.molex.com/pdm_docs/sd/894010410_sd.pdf; ComponentLink1Description: https://www.molex.com/pdm_docs/sd/894010410_sd.pdf; Pricing: 1=0.16, 10=0.15, 100=0.1043, 500=0.08822, 1000=0.07218, 5000=0.06416, 10000=0.05815 (USD); Supplier Part Number: WM13310-ND
footprint CONN_4_POS__0894010410
pins: 1 (io), 2 (io), 3 (io), 4 (io)

## CONN_4_POS__B4B-XH-A(LF)(SN)
designator J?, comment B4B-XH-A(LF)(SN)
CONN HEADER XH TOP 4POS 2.5MM; Manufacturer: JST Sales America Inc.; Material Flammability Rating: UL94 V-0; Voltage Rating: 250V; Current Rating: 3A; Mated Stacking Heights: 9.8mm; Number of Positions Loaded: All; Style: Board to Cable/Wire; Shrouding: Shrouded - 4 Wall; Contact Length - Post: 0.134" (3.40mm); Pitch - Mating: 0.098" (2.50mm); Number of Positions: 4; Insulation Material: Polyamide (PA66), Nylon 6/6; Features: -; Operating Temperature: -25°C ~ 85°C; Applications: -; Contact Finish Thickness - Mating: -; Insulation Color: Natural; Contact Shape: Square; Contact Finish Thickness - Post: -; Ingress Protection: -; Contact Material: Brass; Row Spacing - Mating: -; Mounting Type: Through Hole; Termination: Press-Fit, Solder; Number of Rows: 1; Overall Contact Length: -; Insulation Height: 0.276" (7.00mm); Fastening Type: Detent Lock; Contact Length - Mating: -; Contact Finish - Mating: Tin; Contact Finish - Post: Tin; Category: Connectors, Interconnects; Manufacturer Part Number: B4B-XH-A(LF)(SN); Supplier: Digi-Key; Connector Type: Header; Contact Type: Male Pin; RoHS: RoHS Compliant; Packaging: Bulk; Part Status: Active; ComponentLink1URL: http://www.jst-mfg.com/product/pdf/eng/eXH.pdf; ComponentLink1Description: http://www.jst-mfg.com/product/pdf/eng/eXH.pdf; Supplier Part Number: 455-2249-ND
footprint CONN_4_POS__B4B-XH-A(LF)(SN)
pins: 1 (io), 2 (io), 3 (io), 4 (io)

## CONN_4_POS__S4B-ZR(LF)(SN)
designator J?, comment S4B-ZR(LF)(SN)
CONN HEADER ZH SIDE 4POS 1.5MM; Manufacturer: JST Sales America Inc.; Material Flammability Rating: UL94 V-0; Current Rating: 1A; Voltage Rating: 50V; Pitch - Mating: 0.059" (1.50mm); Number of Positions: 4; Number of Positions Loaded: All; Style: Board to Cable/Wire; Shrouding: Shrouded - 4 Wall; Contact Length - Mating: 0.094" (2.40mm); Contact Length - Post: 0.106" (2.69mm); Insulation Height: 0.146" (3.70mm); Contact Shape: Circular; Contact Finish - Mating: Tin; Contact Finish Thickness - Mating: -; Contact Finish - Post: Tin; Contact Material: Brass; Insulation Material: Polyamide (PA66), Nylon 6/6, Glass Filled; Features: -; Operating Temperature: -25°C ~ 85°C; Ingress Protection: -; Insulation Color: Natural; Mated Stacking Heights: -; Contact Finish Thickness - Post: -; Applications: -; Manufacturer Part Number: S4B-ZR(LF)(SN); Category: Connectors, Interconnects; Supplier: Digi-Key; RoHS: RoHS Compliant; Packaging: Bulk; Part Status: Active; Connector Type: Header; Contact Type: Male Pin; Number of Rows: 1; Row Spacing - Mating: -; Mounting Type: Through Hole, Right Angle; Termination: Press-Fit, Solder; Fastening Type: Detent Lock; Overall Contact Length: -; ComponentLink1URL: http://www.jst-mfg.com/product/pdf/eng/eZH.pdf; ComponentLink1Description: http://www.jst-mfg.com/product/pdf/eng/eZH.pdf; Pricing: 1=0.24, 10=0.228, 100=0.1578, 500=0.1335, 1000=0.10922, 5000=0.09709, 10000=0.08799 (USD); Supplier Part Number: 455-1671-ND
footprint CONN_4_POS__S4B-ZR(LF)(SN)
pins: 1 (io), 2 (io), 3 (io), 4 (io)

## CONN_4_POS__S4B-ZR-SM4A-TF(LF)(SN)
designator J?, comment S4B-ZR-SM4A-TF(LF)(SN)